# Altium footprint library PcbLib1.PcbLib: 56 footprints (part 4 of 4)
Each footprint in its own frame and in the unit in brackets; x right, y up, seen from the top. Pads: shape width x height; smd on the part's side, far side on the other; paste and mask are expansions set on the pad; w line width, h text height; cw(c..) or ccw(c..) is an arc to the next point about the centre after c.
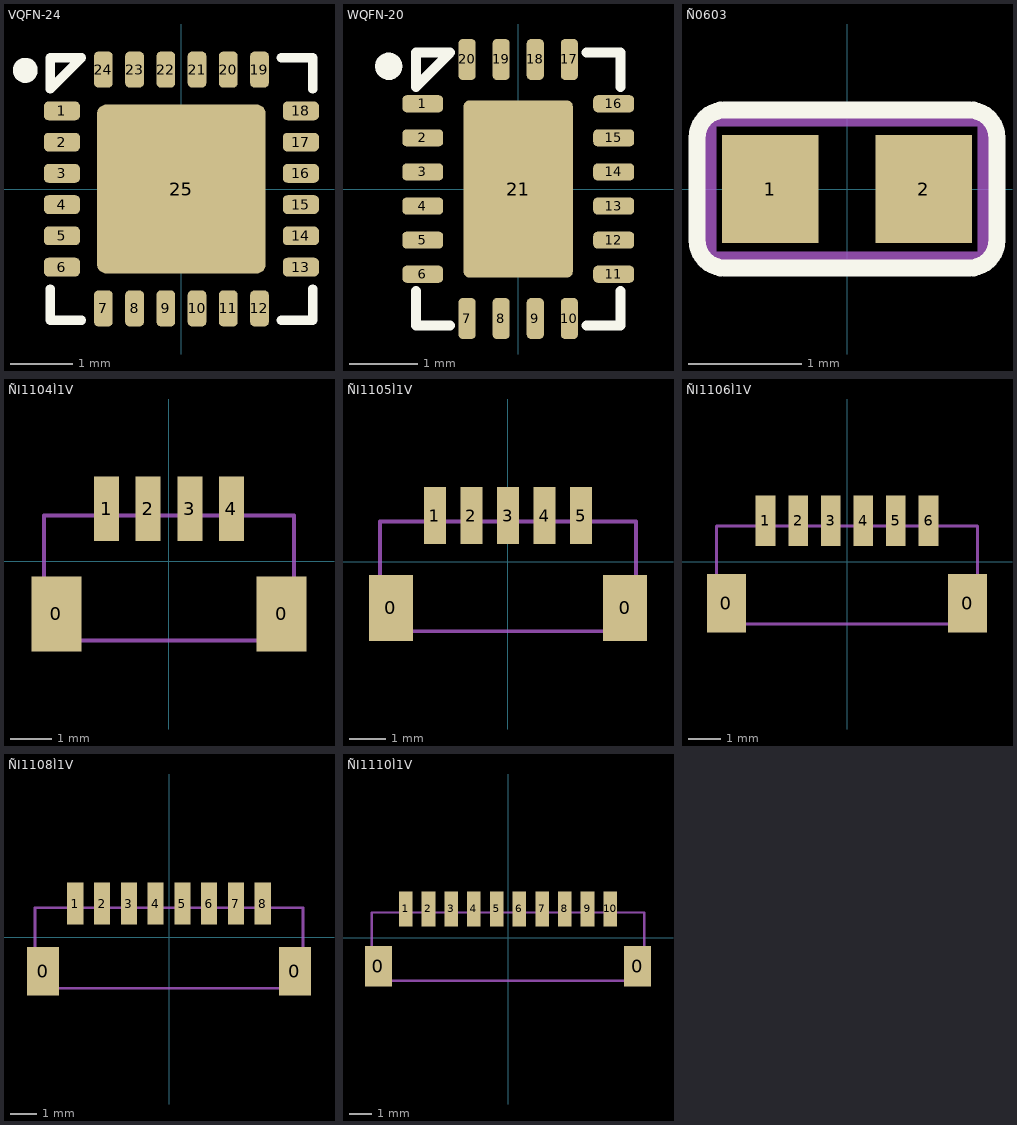
[diagram p3: the footprints below, top view; thin cyan lines are the x and y axes]

## VQFN-24 [mm]
pads (25):
  rrect50% 0.58x0.3 smd mask+0.07: 1(-1.913,1.25) 2(-1.913,0.75) 3(-1.913,0.25) 4(-1.913,-0.25) 5(-1.913,-0.75) 6(-1.913,-1.25) 13(1.913,-1.25) 14(1.913,-0.75) 15(1.913,-0.25) 16(1.913,0.25) 17(1.913,0.75) 18(1.913,1.25)
  rrect50% 0.3x0.58 smd mask+0.07: 7(-1.25,-1.913) 8(-0.75,-1.913) 9(-0.25,-1.913) 10(0.25,-1.913) 11(0.75,-1.913) 12(1.25,-1.913) 19(1.25,1.913) 20(0.75,1.913) 21(0.25,1.913) 22(-0.25,1.913) 23(-0.75,1.913) 24(-1.25,1.913)
  rrect10% 2.7x2.7 smd mask+0.07: 25(0,0)
Top Overlay:
  circle w0.2: c-2.5,1.9 r0.1
  lines w0.15: -2.1,-1.6 -2.1,-2.1 -1.6,-2.1 ; 1.6,-2.1 2.1,-2.1 2.1,-1.6 ; 1.6,2.1 2.1,2.1 2.1,1.6 ; -2.1,1.6 -1.6,2.1 -2.1,2.1 -2.1,1.6
3D body "VQFN-24.step": height 1.05, standoff -0.02, extent -2.05,-2.05 2.05,2.05

## WQFN-20 [mm]
height 0.8
pads (21):
  rrect50% 0.6x0.25 smd mask+0.07: 1(-1.4,1.25) 2(-1.4,0.75) 3(-1.4,0.25) 4(-1.4,-0.25) 5(-1.4,-0.75) 6(-1.4,-1.25) 11(1.4,-1.25) 12(1.4,-0.75) 13(1.4,-0.25) 14(1.4,0.25) 15(1.4,0.75) 16(1.4,1.25)
  rrect50% 0.25x0.6 smd mask+0.07: 7(-0.75,-1.9) 8(-0.25,-1.9) 9(0.25,-1.9) 10(0.75,-1.9) 17(0.75,1.9) 18(0.25,1.9) 19(-0.25,1.9) 20(-0.75,1.9)
  rrect10% 1.6x2.6 smd mask+0.07: 21(0,0)
Top Overlay:
  circle w0.2: c-1.9,1.8 r0.1
  lines w0.15: -1.5,-1.5 -1.5,-2 -1,-2 ; 1,-2 1.5,-2 1.5,-1.5 ; 1,2 1.5,2 1.5,1.5 ; -1.5,1.5 -1.5,2 -1,2 -1.5,1.5 ; -1.5,1.5 -1.5,1.5
3D body "WQFN20.step": height 0.81, standoff -0.01, extent -1.51,-2.01 1.51,2.01

## Ñ0603 [mm]
pads (2):
  rect 0.85x0.95 smd: 1(-0.675,0) 2(0.675,0)
Top Overlay:
  lines w0.15: -1.322,-0.45 ccw(c-1.075,-0.45) -1.075,-0.697 1.075,-0.697 ccw(c1.075,-0.45) 1.322,-0.45 1.322,0.45 ccw(c1.075,0.45) 1.075,0.697 -1.075,0.697 ccw(c-1.075,0.45) -1.322,0.45 -1.322,-0.45
Mechanical 15:
  lines w0.1: -1.2,-0.6 -1.2,0.6 1.2,0.6 1.2,-0.6 -1.2,-0.6
  text ".Designator" at -0.7,-0.1 h0.3
3D body "cap0603.step": height 0.9, standoff 0, extent -0.8,-0.4 0.8,0.4

## ÑI1104Ì1V [mm] "4pin"
pads (6):
  rect 1.2x1.8 smd: 0(-2.7,-1.262) 0(2.7,-1.262)
  rect 0.6x1.55 smd: 1(-1.5,1.262) 2(-0.5,1.262) 3(0.5,1.262) 4(1.5,1.262)
Mechanical 15:
  lines w0.1: -3,-1.9 -3,1.1 3,1.1 3,-1.9 -3,-1.9
  text ".Designator" at -2.1,-0.437 h0.5
3D body: height 4.25, standoff 0, extent -3,-1.862 3,1.038

## ÑI1105Ì1V [mm] "5pin"
pads (7):
  rect 1.2x1.8 smd: 0(-3.2,-1.262) 0(3.2,-1.262)
  rect 0.6x1.55 smd: 1(-2,1.262) 2(-1,1.262) 3(0,1.262) 4(1,1.262) 5(2,1.262)
Mechanical 15:
  lines w0.1: -3.5,-1.9 3.5,-1.9 3.5,1.1 -3.5,1.1 -3.5,-1.9
  text ".Designator" at -1.9,-0.4 h0.5
3D body: height 4.25, standoff 0, extent -3.5,-1.862 3.5,1.038

## ÑI1106Ì1V [mm] "6pin"
pads (8):
  rect 1.2x1.8 smd: 0(-3.7,-1.262) 0(3.7,-1.262)
  rect 0.6x1.55 smd: 1(-2.5,1.262) 2(-1.5,1.262) 3(-0.5,1.262) 4(0.5,1.262) 5(1.5,1.262) 6(2.5,1.262)
Mechanical 15:
  lines w0.1: -4,-1.9 4,-1.9 4,1.1 -4,1.1 -4,-1.9
  text ".Designator" at -1.9,-0.4 h0.5
3D body: height 4.25, standoff 0, extent -4,-1.862 4,1.038

## ÑI1108Ì1V [mm] "8pin"
pads (10):
  rect 1.2x1.8 smd: 0(-4.7,-1.262) 0(4.7,-1.262)
  rect 0.6x1.55 smd: 1(-3.5,1.262) 2(-2.5,1.262) 3(-1.5,1.262) 4(-0.5,1.262) 5(0.5,1.262) 6(1.5,1.262) 7(2.5,1.262) 8(3.5,1.262)
Mechanical 15:
  lines w0.1: -5,-1.9 -5,1.1 5,1.1 5,-1.9 -5,-1.9
  text ".Designator" at -1.9,-0.4 h0.5
3D body: height 4.25, standoff 0, extent -5,-1.862 5,1.038

## ÑI1110Ì1V [mm] "8pin"
pads (12):
  rect 1.2x1.8 smd: 0(-5.7,-1.262) 0(5.7,-1.262)
  rect 0.6x1.55 smd: 1(-4.5,1.262) 2(-3.5,1.262) 3(-2.5,1.262) 4(-1.5,1.262) 5(-0.5,1.262) 6(0.5,1.262) 7(1.5,1.262) 8(2.5,1.262) 9(3.5,1.262) 10(4.5,1.262)
Mechanical 15:
  lines w0.1: -6,-1.9 -6,1.1 6,1.1 6,-1.9 -6,-1.9
  text ".Designator" at -2.1,-0.562 h0.5
3D body: height 4.25, standoff 0, extent -6,-1.862 6,1.038